# Altium footprint library Hydrolib_pcb.PcbLib: 97 footprints (part 6 of 7)
Each footprint in its own frame and in the unit in brackets; x right, y up, seen from the top. Pads: shape width x height; smd on the part's side, far side on the other; paste and mask are expansions set on the pad; w line width, h text height; cw(c..) or ccw(c..) is an arc to the next point about the centre after c.
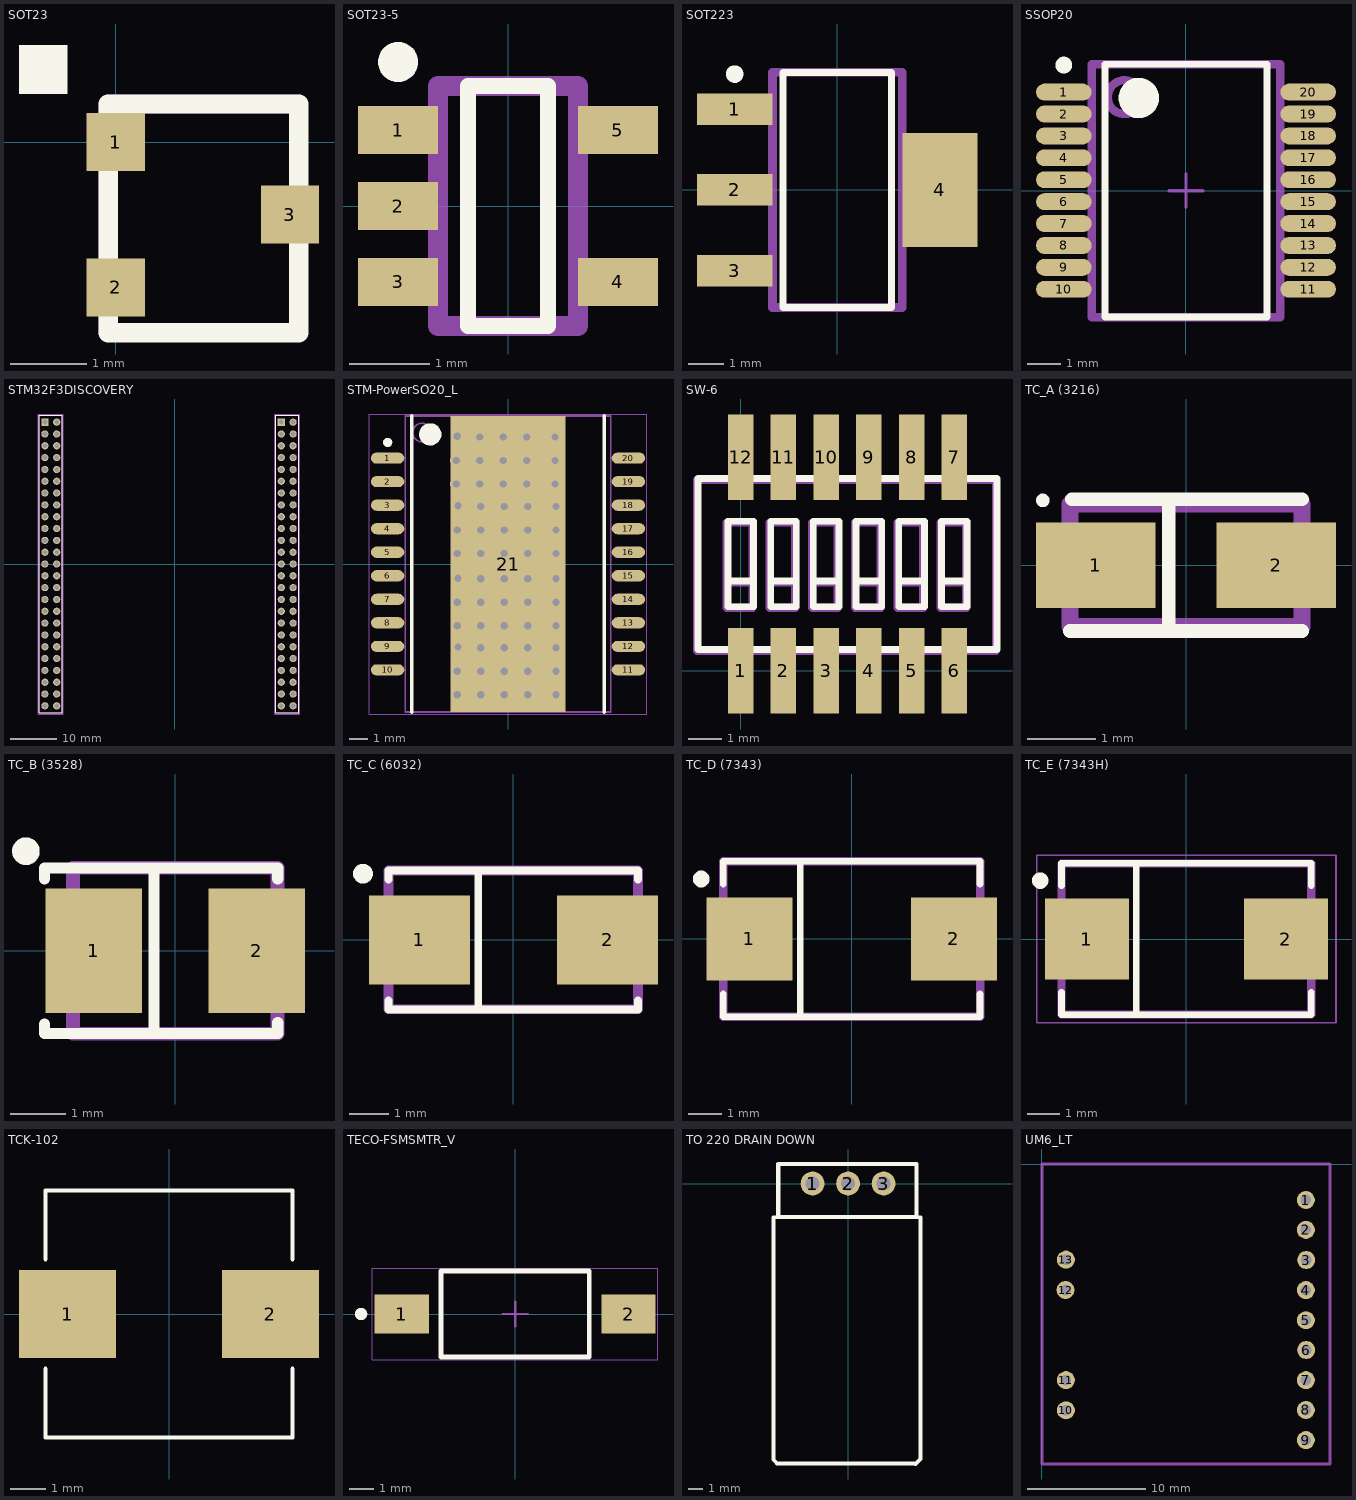
[diagram p5: the footprints below, top view; thin cyan lines are the x and y axes]

## SOT23 [mil]
height 118.11
pads (3):
  rect 30x30 smd: 1(0,0) 2(0,-75) 3(90,-37.5)
Top Overlay:
  region: -50,25 -25,25 -25,50 -50,50
  lines w10: -3.94,-98.43 -3.94,19.68 94.49,19.68 94.49,-98.43 -3.94,-98.43
Pattern top:
  lines w9.84: -3.94,-98.43 -3.94,19.68 94.49,19.68 94.49,-98.43 -3.94,-98.43
  text ".Designator" at 149.61,196.96 h84.65
3D body "SOT-23.step": height 41.34, standoff -1.97, extent -4,-97 94.43,21.11

## SOT23-5 [mm] "SOT23-5, max999"
height 1.45
pads (5):
  rect 1x0.6 smd: 1(-1.375,0.95) 2(-1.375,0) 3(-1.375,-0.95) 4(1.375,-0.95) 5(1.375,0.95)
Top Overlay:
  circle w0.25: c-1.375,1.8 r0.125
  lines w0.2: -0.5,-1.5 0.5,-1.5 0.5,1.5 -0.5,1.5 -0.5,-1.5
Pattern top:
  lines w0.25: -0.875,-1.5 -0.875,1.5 0.875,1.5 0.875,-1.5 -0.875,-1.5
  text ".Designator" at 0.5,-2.7 h2.15
3D body: height 1.45, standoff 0.01, extent -0.875,-1.5 0.875,1.5

## SOT223 [mm] "SOT223, ld1117"
height 1.8
pads (4):
  rect 2.15x0.9 smd: 1(-2.925,2.3) 2(-2.925,0) 3(-2.925,-2.3)
  rect 2.15x3.25 smd: 4(2.925,0)
Top Overlay:
  circle w0.25: c-2.925,3.3 r0.125
  lines w0.2: -1.55,-3.35 -1.55,3.35 1.55,3.35 1.55,-3.35 -1.55,-3.35
Pattern top:
  lines w0.25: -1.85,-3.35 -1.85,3.35 1.85,3.35 1.85,-3.35 -1.85,-3.35
  text ".Designator" at 0.7,-2.9 h2.15
3D body "SOT223-3.step": height 1.6, standoff 0, extent -3.562,-3.3 3.512,3.2

## SSOP20 [mm] "For ADM3260"
height 2
pads (20):
  oval 1.65x0.5 smd: 1(-3.625,2.925) 2(-3.625,2.275) 3(-3.625,1.625) 4(-3.625,0.975) 5(-3.625,0.325) 6(-3.625,-0.325) 7(-3.625,-0.975) 8(-3.625,-1.625) 9(-3.625,-2.275) 10(-3.625,-2.925) 11(3.625,-2.925) 12(3.625,-2.275) 13(3.625,-1.625) 14(3.625,-0.975) 15(3.625,-0.325) 16(3.625,0.325) 17(3.625,0.975) 18(3.625,1.625) 19(3.625,2.275) 20(3.625,2.925)
Top Overlay:
  circle w0.6: c-1.4,2.75 r0.3
  circle w0.25: c-3.625,3.725 r0.125
  lines w0.2: -2.4,-3.75 2.4,-3.75 2.4,3.75 -2.4,3.75 -2.4,-3.75
Pattern top:
  circle w0.25: c-1.825,2.775 r0.5
  lines w0.25: -2.8,-3.75 2.8,-3.75 2.8,3.75 -2.8,3.75 -2.8,-3.75
Mechanical 15:
  lines w0.1: -0.5,0 0.5,0 ; 0,-0.5 0,0.5
3D body "SOP65P780X200-20N.step": height 2, standoff 0, extent -3.9,-3.75 3.9,3.75

## STM32F3DISCOVERY [mm] "Socket, 2x25 Pins, Vertical, 2.54mm Pitch, Female"
height 8.51
pads (100):
  rect 1.55x1.55 hole 1.04: 1(-27.94,30.48) 51(22.86,30.48)
  round 1.55 hole 1.04: 2(-25.4,30.48) 3(-27.94,27.94) 4(-25.4,27.94) 5(-27.94,25.4) 6(-25.4,25.4) 7(-27.94,22.86) 8(-25.4,22.86) 9(-27.94,20.32) 10(-25.4,20.32) 11(-27.94,17.78) 12(-25.4,17.78) 13(-27.94,15.24) 14(-25.4,15.24) 15(-27.94,12.7) 16(-25.4,12.7) 17(-27.94,10.16) 18(-25.4,10.16) 19(-27.94,7.62) 20(-25.4,7.62) 21(-27.94,5.08) 22(-25.4,5.08) 23(-27.94,2.54) 24(-25.4,2.54) 25(-27.94,0) 26(-25.4,0) 27(-27.94,-2.54) 28(-25.4,-2.54) 29(-27.94,-5.08) 30(-25.4,-5.08) 31(-27.94,-7.62) 32(-25.4,-7.62) 33(-27.94,-10.16) 34(-25.4,-10.16) 35(-27.94,-12.7) 36(-25.4,-12.7) 37(-27.94,-15.24) 38(-25.4,-15.24) 39(-27.94,-17.78) 40(-25.4,-17.78) 41(-27.94,-20.32) 42(-25.4,-20.32) 43(-27.94,-22.86) 44(-25.4,-22.86) 45(-27.94,-25.4) 46(-25.4,-25.4) 47(-27.94,-27.94) 48(-25.4,-27.94) 49(-27.94,-30.48) 50(-25.4,-30.48) 52(25.4,30.48) 53(22.86,27.94) 54(25.4,27.94) 55(22.86,25.4) 56(25.4,25.4) 57(22.86,22.86) 58(25.4,22.86) 59(22.86,20.32) 60(25.4,20.32) 61(22.86,17.78) 62(25.4,17.78) 63(22.86,15.24) 64(25.4,15.24) 65(22.86,12.7) 66(25.4,12.7) 67(22.86,10.16) 68(25.4,10.16) 69(22.86,7.62) 70(25.4,7.62) 71(22.86,5.08) 72(25.4,5.08) 73(22.86,2.54) 74(25.4,2.54) 75(22.86,0) 76(25.4,0) 77(22.86,-2.54) 78(25.4,-2.54) 79(22.86,-5.08) 80(25.4,-5.08) 81(22.86,-7.62) 82(25.4,-7.62) 83(22.86,-10.16) 84(25.4,-10.16) 85(22.86,-12.7) 86(25.4,-12.7) 87(22.86,-15.24) 88(25.4,-15.24) 89(22.86,-17.78) 90(25.4,-17.78) 91(22.86,-20.32) 92(25.4,-20.32) 93(22.86,-22.86) 94(25.4,-22.86) 95(22.86,-25.4) 96(25.4,-25.4) 97(22.86,-27.94) 98(25.4,-27.94) 99(22.86,-30.48) 100(25.4,-30.48)
Top Overlay:
  lines w0.2: -29.145,-32.005 -29.145,32.005 -24.195,32.005 -24.195,-32.005 -29.145,-32.005 ; 21.655,-32.005 26.605,-32.005 26.605,32.005 21.655,32.005 21.655,-32.005
Mechanical 13:
  lines w0.1: -29.145,-32.005 -24.195,-32.005 -24.195,32.005 -29.145,32.005 -29.145,-32.005 ; 21.655,-32.005 26.605,-32.005 26.605,32.005 21.655,32.005 21.655,-32.005
Mechanical 15:
  lines w0.05: -29.37,-32.23 -29.37,32.23 -23.97,32.23 -23.97,-32.23 -29.37,-32.23 ; 21.43,-32.23 26.83,-32.23 26.83,32.23 21.43,32.23 21.43,-32.23
3D body "SSW-125-01-X-D.step": height 8.41, standoff -2.64, extent -29.147,-32.004 -24.194,32.004
3D body "SSW-125-01-X-D.step": height 8.41, standoff -2.64, extent 21.653,-32.004 26.606,32.004
3D body "UNK_STMicroelectronics_STM32F3DISCOVERY_eec.STEP": height 22.72, standoff 2.42, extent -34.321,-32.684 31.679,64.804

## STM-PowerSO20_L [mm] "SOIC, 20-Leads, Body 16x11.1mm, Pitch 1.27mm, Thermal Pad 16x6.2mm, IPC High Density"
height 3.6
pads (21):
  oval 1.8x0.6 smd: 1(-6.5,5.715) 2(-6.5,4.445) 3(-6.5,3.175) 4(-6.5,1.905) 5(-6.5,0.635) 6(-6.5,-0.635) 7(-6.5,-1.905) 8(-6.5,-3.175) 9(-6.5,-4.445) 10(-6.5,-5.715) 11(6.5,-5.715) 12(6.5,-4.445) 13(6.5,-3.175) 14(6.5,-1.905) 15(6.5,-0.635) 16(6.5,0.635) 17(6.5,1.905) 18(6.5,3.175) 19(6.5,4.445) 20(6.5,5.715)
  rect 6.2x16 smd: 21(0,0)
via 2.54,4.318 diameter 0.7 hole 0.4
via 1.016,4.318 diameter 0.7 hole 0.4
via -0.254,4.318 diameter 0.7 hole 0.4
via -1.524,4.318 diameter 0.7 hole 0.4
via -2.794,4.318 diameter 0.7 hole 0.4
via 2.54,5.588 diameter 0.7 hole 0.4
via 1.016,5.588 diameter 0.7 hole 0.4
via -0.254,5.588 diameter 0.7 hole 0.4
via -1.524,5.588 diameter 0.7 hole 0.4
via -2.794,5.588 diameter 0.7 hole 0.4
via 2.54,6.858 diameter 0.7 hole 0.4
via 1.016,6.858 diameter 0.7 hole 0.4
via -0.254,6.858 diameter 0.7 hole 0.4
via -1.524,6.858 diameter 0.7 hole 0.4
via -2.75,6.896 diameter 0.7 hole 0.4
via -2.698,3.145 diameter 0.7 hole 0.4
via -1.472,3.107 diameter 0.7 hole 0.4
via -0.202,3.107 diameter 0.7 hole 0.4
via 1.068,3.107 diameter 0.7 hole 0.4
via 2.592,3.107 diameter 0.7 hole 0.4
via -2.742,1.837 diameter 0.7 hole 0.4
via -1.472,1.837 diameter 0.7 hole 0.4
via -0.202,1.837 diameter 0.7 hole 0.4
via 1.068,1.837 diameter 0.7 hole 0.4
via 2.592,1.837 diameter 0.7 hole 0.4
via -2.742,0.567 diameter 0.7 hole 0.4
via -1.472,0.567 diameter 0.7 hole 0.4
via -0.202,0.567 diameter 0.7 hole 0.4
via 1.068,0.567 diameter 0.7 hole 0.4
via 2.592,0.567 diameter 0.7 hole 0.4
via -2.698,-0.765 diameter 0.7 hole 0.4
via -1.472,-0.803 diameter 0.7 hole 0.4
via -0.202,-0.803 diameter 0.7 hole 0.4
via 1.068,-0.803 diameter 0.7 hole 0.4
via 2.592,-0.803 diameter 0.7 hole 0.4
via -2.742,-2.073 diameter 0.7 hole 0.4
via -1.472,-2.073 diameter 0.7 hole 0.4
via -0.202,-2.073 diameter 0.7 hole 0.4
via 1.068,-2.073 diameter 0.7 hole 0.4
via 2.592,-2.073 diameter 0.7 hole 0.4
via -2.742,-3.343 diameter 0.7 hole 0.4
via -1.472,-3.343 diameter 0.7 hole 0.4
via -0.202,-3.343 diameter 0.7 hole 0.4
via 1.068,-3.343 diameter 0.7 hole 0.4
via 2.592,-3.343 diameter 0.7 hole 0.4
via -2.698,-4.484 diameter 0.7 hole 0.4
via -1.472,-4.522 diameter 0.7 hole 0.4
via -0.202,-4.522 diameter 0.7 hole 0.4
via 1.068,-4.522 diameter 0.7 hole 0.4
via 2.592,-4.522 diameter 0.7 hole 0.4
via -2.742,-5.792 diameter 0.7 hole 0.4
via -1.472,-5.792 diameter 0.7 hole 0.4
via -0.202,-5.792 diameter 0.7 hole 0.4
via 1.068,-5.792 diameter 0.7 hole 0.4
via 2.592,-5.792 diameter 0.7 hole 0.4
via -2.742,-7.062 diameter 0.7 hole 0.4
via -1.472,-7.062 diameter 0.7 hole 0.4
via -0.202,-7.062 diameter 0.7 hole 0.4
via 1.068,-7.062 diameter 0.7 hole 0.4
via 2.592,-7.062 diameter 0.7 hole 0.4
Top Overlay:
  circle w0.25: c-6.5,6.565 r0.125
  circle w0.6: c-4.2,7 r0.3
  lines w0.2: -5.2,-8 -5.2,8 ; 5.2,-8 5.2,8
Mechanical 13:
  circle w0.1: c-4.65,7.1 r0.5
  lines w0.1: -5.55,-8 -5.55,8 5.55,8 5.55,-8 -5.55,-8
Mechanical 15:
  lines w0.05: -7.5,-8.1 -7.5,8.1 7.5,8.1 7.5,-8.1 -7.5,-8.1
  lines w0.1: -0.5,0 0.5,0 ; 0,-0.5 0,0.5
3D body "SOIC127P1420X360_HS-21L.step": height 3.6, standoff 0, extent -7.1,-8 7.1,8

## SW-6 [mil]
height 75.2
pads (12):
  rect 30x100 smd: 1(0,0) 2(50,0) 3(100,0) 4(150,0) 5(200,0) 6(250,0) 7(250,250) 8(200,250) 9(150,250) 10(100,250) 11(50,250) 12(0,250)
Top Overlay:
  lines w7.87: -15,105 15,105 ; 35,105 65,105 ; 85,105 115,105 ; 135,105 165,105 ; 185,105 215,105 ; 235,105 265,105 ; -50,25 300,25 300,225 -50,225 -50,25 ; -15,75 -15,175 15,175 15,75 -15,75 ; 35,75 35,175 65,175 65,75 35,75 ; 85,75 85,175 115,175 115,75 85,75 ; 135,75 135,175 165,175 165,75 135,75 ; 185,75 185,175 215,175 215,75 185,75 ; 235,75 235,175 265,175 265,75 235,75
Pattern top:
  lines w9.84: -16.18,103.62 13.82,103.62 ; 33.82,103.62 63.82,103.62 ; 83.82,103.62 113.82,103.62 ; 133.82,103.62 163.82,103.62 ; 183.82,103.62 213.82,103.62 ; 233.82,103.62 263.82,103.62 ; -51.18,23.62 298.82,23.62 298.82,223.62 -51.18,223.62 -51.18,23.62 ; -16.18,73.62 -16.18,173.62 13.82,173.62 13.82,73.62 -16.18,73.62 ; 33.82,73.62 33.82,173.62 63.82,173.62 63.82,73.62 33.82,73.62 ; 83.82,73.62 83.82,173.62 113.82,173.62 113.82,73.62 83.82,73.62 ; 133.82,73.62 133.82,173.62 163.82,173.62 163.82,73.62 133.82,73.62 ; 183.82,73.62 183.82,173.62 213.82,173.62 213.82,73.62 183.82,73.62 ; 233.82,73.62 233.82,173.62 263.82,173.62 263.82,73.62 233.82,73.62
3D body "NHDS-6.STEP": height 90.55, standoff 0, extent -52.15,-12.79 302.18,250.99

## TC_A (3216) [mm] "Tantalum capacitor, type A,  1 pin - plus"
height 1.8
pads (2):
  rect 1.75x1.25 smd: 1(-1.325,0) 2(1.325,0)
Top Overlay:
  circle w0.1: c-2.1,0.95 r0.05
  lines w0.2: -1.702,-0.965 -0.254,-0.965 ; -1.676,0.965 -0.254,0.965 ; 1.702,-0.965 -0.254,-0.965 ; 1.702,0.965 -0.254,0.965 ; -0.254,-0.965 -0.254,0.965
Pattern top:
  lines w0.25: -1.7,-0.9 1.7,-0.9 1.7,0.9 -1.7,0.9 -1.7,-0.9
  text ".Designator" at 3.7,5.303 h2.15
3D body "Tant Cap SMD size A _ 3216-18.stp": height 1.64, standoff 0.01, extent -1.73,-0.8 1.73,0.8

## TC_B (3528) [mm] "Tantalum capacitor, type B, 1 pin - plus"
height 2.1
pads (2):
  rect 1.75x2.25 smd: 1(-1.475,0) 2(1.475,0)
Top Overlay:
  circle w0.25: c-2.7,1.8 r0.125
  lines w0.2: -2.362,-1.321 -2.362,-1.499 -2.361,-1.5 -0.381,-1.5 1.854,-1.5 1.854,-1.295 ; -2.361,1.295 -2.361,1.5 -0.381,1.5 ; -0.381,-1.499 -0.381,1.5 ; 1.854,1.295 1.854,1.5 -0.381,1.5
Pattern top:
  lines w0.25: -1.85,-1.5 -1.85,1.5 1.85,1.5 1.85,-1.5 -1.85,-1.5
  text ".Designator" at 3.4,6.203 h2.15
3D body "CAPM-TANTB-BK.stp": height 2.1, standoff 0, extent -1.85,-1.5 1.85,1.5

## TC_C (6032) [mm] "Tantalum capacitor, type C, 1 pin - plus"
height 2.8
pads (2):
  rect 2.55x2.25 smd: 1(-2.375,0) 2(2.375,0)
Top Overlay:
  circle w0.25: c-3.8,1.675 r0.125
  lines w0.2: -3.15,-1.525 -3.15,-1.75 3.15,-1.75 3.15,-1.525 ; -3.15,1.525 -3.15,1.75 3.15,1.75 3.15,1.525 ; -0.889,-1.75 -0.889,1.75
Pattern top:
  lines w0.25: -3.15,-1.75 3.15,-1.75 3.15,1.75 -3.15,1.75 -3.15,-1.75
  text ".Designator" at 0.9,6.303 h2.15
3D body "CAPM-TANTC-YL.stp": height 2.8, standoff 0, extent -3.1,-1.7 3.1,1.7

## TC_D (7343) [mm] "Tantalum capacitor, type D, 1 pin - plus"
height 3.1
pads (2):
  rect 2.55x2.45 smd: 1(-3.025,0) 2(3.025,0)
Top Overlay:
  circle w0.25: c-4.45,1.775 r0.125
  lines w0.2: -3.8,-1.625 -3.8,-2.3 3.8,-2.3 3.8,-1.625 ; -3.8,1.625 -3.8,2.3 3.8,2.3 3.8,1.625 ; -1.524,-2.3 -1.524,2.3
Pattern top:
  lines w0.25: -3.8,-2.3 3.8,-2.3 3.8,2.3 -3.8,2.3 -3.8,-2.3
  text ".Designator" at 1.3,6.903 h2.15
3D body "CAPM-TANTD-YL.stp": height 3.1, standoff 0, extent -3.75,-2.25 3.75,2.25

## TC_E (7343H) [mm] "Tantalum capacitor, type E, 1 pin - plus"
height 4.3
pads (2):
  rect 2.55x2.45 smd: 1(-3.025,0) 2(3.025,0)
Top Overlay:
  circle w0.25: c-4.45,1.775 r0.125
  lines w0.2: -3.8,-1.625 -3.8,-2.3 3.8,-2.3 3.8,-1.625 ; -3.8,1.625 -3.8,2.3 3.8,2.3 3.8,1.625 ; -1.524,-2.3 -1.524,2.3
Pattern top:
  lines w0.25: -3.8,-2.3 -3.8,2.3 3.8,2.3 3.8,-2.3 -3.8,-2.3
  text ".Designator" at 0.8,6.703 h2.15
Mechanical 15:
  lines w0.05: -4.55,-2.55 -4.55,2.55 4.55,2.55 4.55,-2.55 -4.55,-2.55
3D body "CAPM-TANTN-BK.stp": height 3, standoff 0, extent -3.75,-2.25 3.75,2.25

## TCK-102 [mm]
pads (2):
  rect 2.75x2.5 smd: 1(-2.875,0) 2(2.875,0)
Top Overlay:
  lines w0.125: -3.5,-1.55 -3.5,-3.5 3.5,-3.5 3.5,-1.55 ; -3.5,1.55 -3.5,3.5 3.5,3.5 3.5,1.55
3D body: height 4.2, standoff 0, extent -3.25,-3.25 3.25,3.25

## TECO-FSMSMTR_V [mm] "SMD, 2-Leads, Body 6x3.5mm, Pitch 9.19mm"
height 4.57
pads (2):
  rect 2.2x1.6 smd: 1(-4.595,0)
  rect 2.18x1.6 smd: 2(4.595,0)
Top Overlay:
  circle w0.25: c-6.245,0 r0.125
  lines w0.2: -3,-1.75 -3,1.75 3,1.75 3,-1.75 -3,-1.75
Mechanical 13:
  lines w0.1: -3,-1.75 3,-1.75 3,1.75 -3,1.75 -3,-1.75
Mechanical 15:
  lines w0.05: -5.795,-1.85 5.785,-1.85 5.785,1.85 -5.795,1.85 -5.795,-1.85
  lines w0.1: -0.5,0 0.5,0 ; 0,-0.5 0,0.5
3D body "c-1437566-4-c-3d.stp": height 4.4, standoff -0.02, extent -4.984,-1.75 4.985,1.75

## TO 220 DRAIN DOWN [mm]
pads (3):
  round 1.7 hole 1: 1(-2.54,0) 2(0,0) 3(2.54,0)
Top Overlay:
  lines w0.254: -5.076,-20.028 -5.334,-19.77 -5.334,-2.413 5.182,-2.413 5.182,-19.708 4.824,-20.066 ; -4.873,1.397 4.9,1.397
  lines w0.3: -5.076,-20.028 4.824,-20.028 ; -5,-2.4 4.9,-2.4 4.9,1.397 -5,1.397 -5,-2.4
3D body "MOSFET_FLIP.STEP": height 6.88, standoff -4.59, extent -5.27,-19.745 5.27,0.555

## UM6_LT [mil]
pads (13):
  round 60 hole 35.43: 1(879.92,-120) 2(879.92,-219.49) 3(880.91,-320) 4(880,-420.28) 5(880,-520.67) 6(880.91,-620) 7(879.92,-720.47) 8(880,-819.88) 9(879.92,-920.28) 10(80,-820.87) 11(80,-720.47) 12(78.74,-420) 13(80,-318.9)
Template:
  lines w10: 960,-1000 0,-1000 0,0 960,0 960.63,-1000
Pattern top:
  text "String" at 192.91,59.06 h83.86
3D body "Сборка_2.STEP": height 472.44, standoff -15.75, extent -0.01,-1000 959.84,0